# Altium footprint library mastermind.PCBLIB: 1061 footprints (part 32 of 67)
Each footprint in its own frame and in the unit in brackets; x right, y up, seen from the top. Pads: shape width x height; smd on the part's side, far side on the other; paste and mask are expansions set on the pad; w line width, h text height; cw(c..) or ccw(c..) is an arc to the next point about the centre after c.
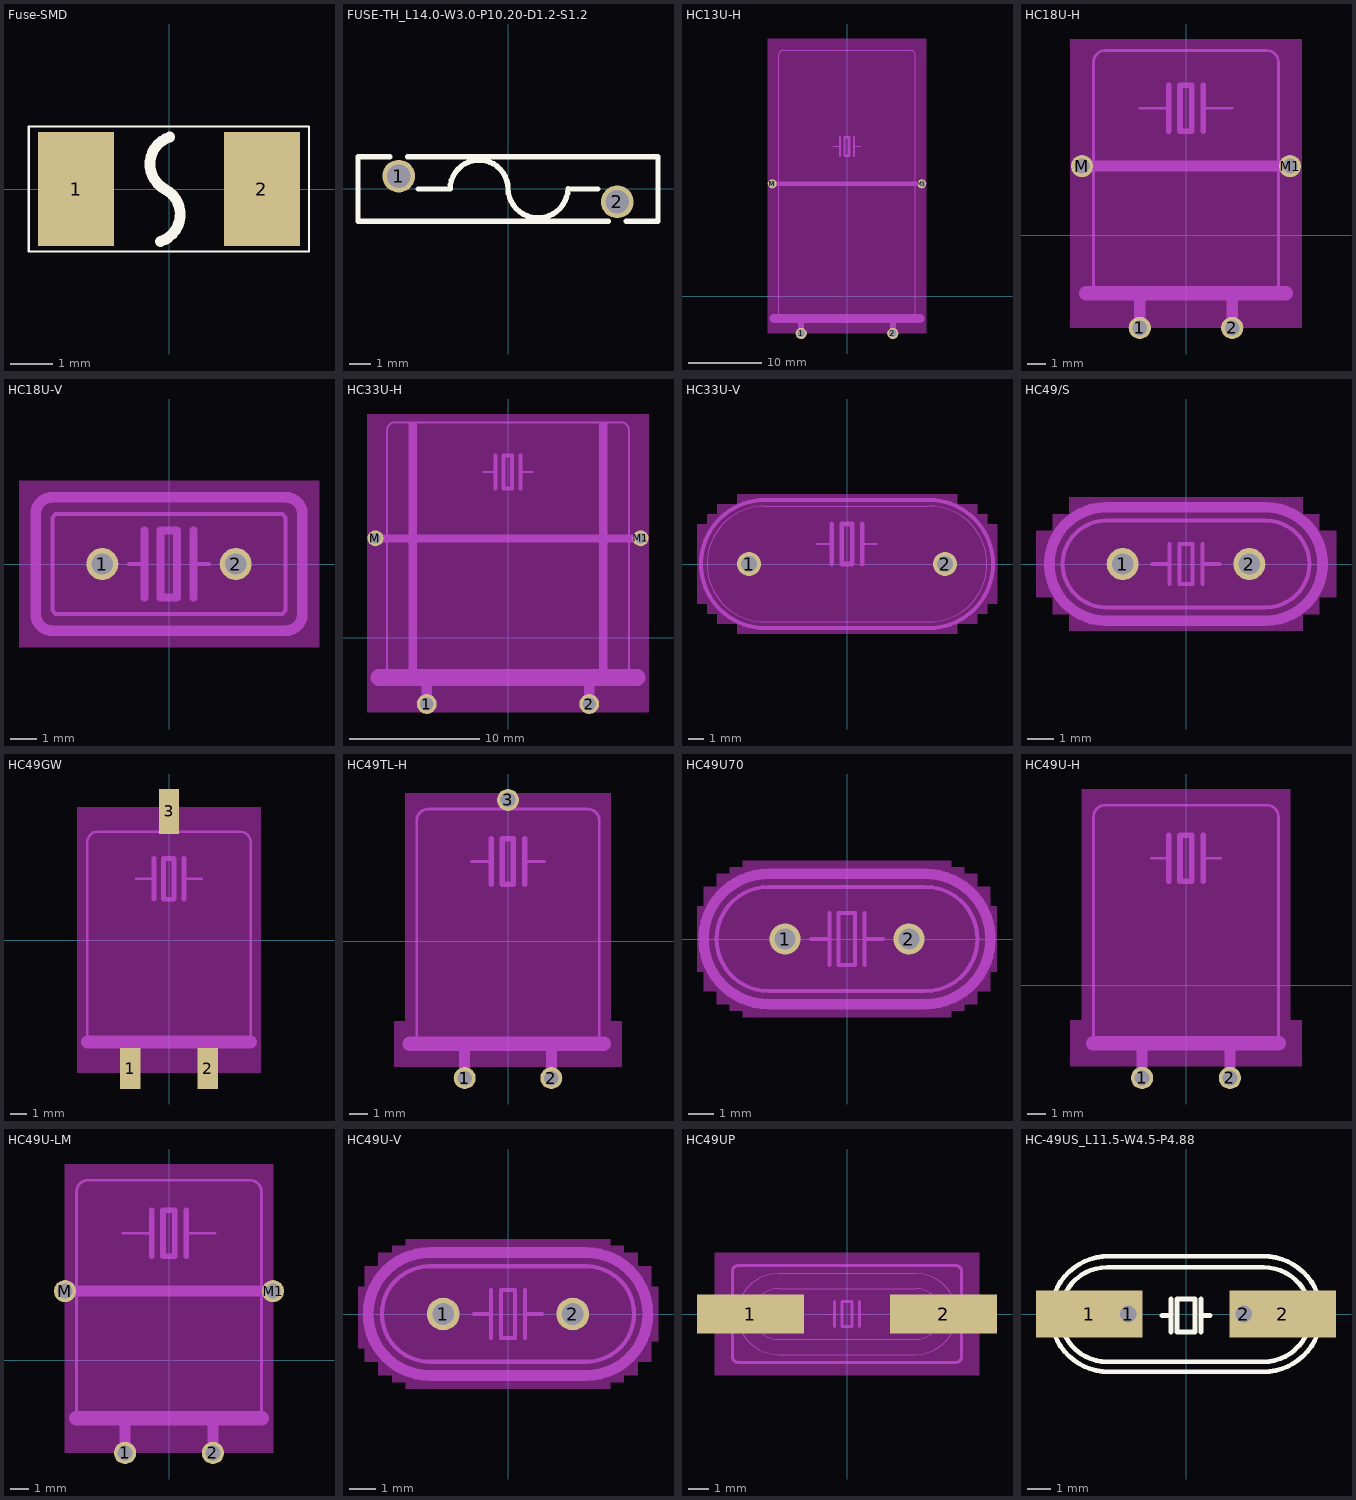
[diagram p31: the footprints below, top view; thin cyan lines are the x and y axes]

## Fuse-SMD [mm]
pads (2):
  rect 1.8x2.7 smd: 1(-2.2,0) 2(2.2,0)
Top Overlay:
  lines w0.051: -3.32,-1.483 3.31,-1.483 3.31,1.483 -3.32,1.483 -3.32,-1.483
  lines w0.254: -0.202,-1.244 ccw(c-0.408,-0.602) -0.093,-0.007 cw(c0.222,0.588) 0.017,1.23
Mechanical 8:
  region: -2.489,-1.321 -2.489,1.329 -1.639,1.329 -1.639,-1.321
  region: 1.651,-1.321 1.651,1.329 2.501,1.329 2.501,-1.321

## FUSE-TH_L14.0-W3.0-P10.20-D1.2-S1.2 [mil]
pads (2):
  round 60 hole 43.31 paste-99999 mask+2: 1(-200.79,23.63) 2(200.79,-23.62)
Top Overlay:
  lines w10: -239.89,59.05 -275.59,59.05 ; -217.19,59.05 -275.59,59.05 ; -184.38,59.05 4.33,59.05 ; -165.35,0 -106.3,0 cw(c-53.15,0) 0,0 ; -161.69,59.05 275.59,59.05 275.59,-59.06 239.89,-59.06 ; 0,0.5 ccw(c55.1,1.98) 110.2,0.5 ; 110.24,0 165.35,0 ; 112.33,-59.06 184.41,-59.06 ; 161.69,-59.06 -275.59,-59.06 -275.59,59.05 ; 217.17,-59.06 260.33,-59.06

## HC13U-H [mil]
pads (4):
  round 60 hole 40: 1(-245,-200) 2(245,-200)
  round 48 hole 32: M(-400,600) M1(400,600)
Top Layer keep-out:
  region: -425,-200 -425,1375 425,1375 425,-200
Mechanical 2:
  lines w6: -365,-120 -365,580 ; -365,620 -365,1290 cw(c-340,1290) -340,1315 340,1315 cw(c340,1290) 365,1290 365,620 ; -75,800 -37,800 ; 37,800 75,800 ; 365,-120 365,580
  lines w12: -37,750 -37,800 -37,850 ; 37,750 37,800 37,850 ; -13,750 -13,850 12,850 12,750 -13,750
  lines w24: -355,600 355,600
  lines w50: -390,-120 -365,-120 365,-120 390,-120
Mechanical 8:
  lines w6: -365,580 -365,620 ; 365,580 365,620
  lines w24: -400,600 -360,600 ; 360,600 400,600
  lines w32: -245,-200 -245,-125 ; 245,-200 245,-125

## HC18U-H [mil]
pads (4):
  round 48 hole 32: 1(-100,-200) 2(100,-200) M(-225,150) M1(225,150)
Top Layer keep-out:
  region: -250,-200 -250,425 250,425 250,-200
Mechanical 2:
  lines w6: -200,-125 -200,125 ; -200,175 -200,375 cw(c-175,375) -175,400 175,400 cw(c175,375) 200,375 200,180 ; -100,275 -37,275 ; 37,275 100,275 ; 200,-125 200,120
  lines w12: -37,225 -37,275 -37,325 ; 37,225 37,275 37,325 ; -13,225 -13,325 12,325 12,225 -13,225
  lines w24: -180,150 180,150
  lines w32: -215,-125 -200,-125 200,-125 215,-125
Mechanical 8:
  lines w6: -200,125 -200,175 ; 200,120 200,150 200,180
  lines w24: -225,150 -185,150 ; -100,-200 -100,-130 ; 100,-200 100,-130 ; 180,150 200,150 225,150

## HC18U-V [mil]
pads (2):
  round 48 hole 32: 1(-100,0) 2(100,0)
Top Layer keep-out:
  region: -225,-125 -225,125 225,125 225,-125
Mechanical 2:
  lines w6: -60,0 -37,0 ; 37,0 60,0 ; -175,-70 -170,-75 170,-75 175,-70 175,70 170,75 -170,75 -175,70 -175,-70
  lines w12: -37,-50 -37,0 -37,50 ; 37,-50 37,0 37,50 ; -13,-50 12,-50 12,50 -13,50 -13,-50
  lines w16: -200,-75 ccw(c-175,-75) -175,-100 175,-100 ccw(c175,-75) 200,-75 200,75 ccw(c175,75) 175,100 -175,100 ccw(c-175,75) -200,75 -200,-75

## HC33U-H [mil]
pads (4):
  round 60 hole 40: 1(-245,-200) 2(245,-200)
  round 48 hole 32: M(-400,300) M1(400,300)
Top Layer keep-out:
  region: -425,-225 -425,675 425,675 425,-225
Mechanical 2:
  region: -300,-125 -300,650 -275,650 -275,-125
  region: 275,-125 275,650 300,650 300,-125
  lines w6: -365,-120 -365,280 ; -365,320 -365,625 cw(c-340,625) -340,650 340,650 cw(c340,625) 365,625 365,320 ; -75,500 -37,500 ; 37,500 75,500 ; 365,-120 365,280
  lines w12: -37,450 -37,500 -37,550 ; 37,450 37,500 37,550 ; -13,450 -13,550 12,550 12,450 -13,450
  lines w24: -355,300 355,300
  lines w50: -390,-120 -365,-120 365,-120 390,-120
Mechanical 8:
  lines w6: -365,280 -365,320 ; 365,280 365,320
  lines w24: -400,300 -360,300 ; 360,300 400,300
  lines w32: -245,-200 -245,-125 ; 245,-200 245,-125

## HC33U-V [mil]
pads (2):
  round 60 hole 40: 1(-245,0) 2(245,0)
Top Layer keep-out:
  region: 350,-100 350,100 375,100 375,-100
  region: 325,-125 325,125 350,125 350,-125
  region: 275,-150 275,150 325,150 325,-150
  region: -275,-175 -275,175 275,175 275,-175
  region: -375,-100 -375,100 -350,100 -350,-100
  region: -350,-125 -350,125 -325,125 -325,-125
  region: -325,-150 -325,150 -275,150 -275,-150
Mechanical 2:
  lines w2: -205,-145 cw(c-205,0) -205,145 205,145 cw(c205,0) 205,-145 -205,-145
  lines w6: -75,50 -38,50 ; 38,50 75,50
  lines w10: -205,-160 cw(c-205,0) -205,160 205,160 cw(c205,0) 205,-160 -205,-160
  lines w12: -38,0 -38,50 -38,100 ; 38,0 38,50 38,100 ; -13,0 13,0 13,100 -13,100 -13,0

## HC49/S [mil]
pads (2):
  round 48 hole 32: 1(-95,0) 2(95,0)
Top Layer keep-out:
  region: 200,-50 200,50 225,50 225,-50
  region: 175,-75 175,75 200,75 200,-75
  region: -225,-50 -225,50 -200,50 -200,-50
  region: -200,-75 -200,75 -175,75 -175,-75
  region: -175,-100 -175,100 175,100 175,-100
Mechanical 2:
  lines w6: -50,0 -25,0 ; -25,-30 -25,0 ; -25,30 -25,0 ; 25,-30 25,0 ; 25,30 25,0 ; 50,0 25,0 ; -120,-65 cw(c-120,0) -120,65 120,65 cw(c120,0) 120,-65 -120,-65 ; -10,-30 -10,30 10,30 10,-30 -10,-30
  lines w16: -120,-85 cw(c-120,0) -120,85 120,85 cw(c120,0) 120,-85 -120,-85

## HC49GW [mil]
pads (3):
  rect 50x100 smd: 1(-95,-315) 2(95,-315)
  rect 50x110 smd: 3(0,315)
Top Layer keep-out:
  region: -225,-325 -225,325 225,325 225,-325
Mechanical 2:
  lines w6: -200,-250 -200,240 cw(c-175,240) -175,265 -40,265 ; -80,150 -37,150 ; 37,150 80,150 ; 40,265 175,265 cw(c175,240) 200,240 200,-250
  lines w12: -37,100 -37,150 -37,200 ; 37,100 37,150 37,200 ; -13,100 12,100 12,200 -13,200 -13,100
  lines w32: -200,-250 200,-250
Mechanical 8:
  lines w6: -40,265 40,265
  lines w24: -95,-325 -95,-260 ; 0,275 0,330 ; 95,-330 95,-255

## HC49TL-H [mil]
pads (3):
  round 48 hole 32: 1(-95,-300) 2(95,-300) 3(0,310)
Top Layer keep-out:
  region: -225,-175 -225,325 225,325 225,-175
  region: -250,-275 -250,-175 250,-175 250,-275
Mechanical 2:
  lines w6: -200,-225 -200,265 cw(c-175,265) -175,290 -45,290 ; -80,175 -37,175 ; 37,175 80,175 ; 45,290 175,290 cw(c175,265) 200,265 200,-225
  lines w12: -37,125 -37,175 -37,225 ; 37,125 37,175 37,225 ; -13,125 12,125 12,225 -13,225 -13,125
  lines w32: -215,-225 210,-225
Mechanical 8:
  region: -12,290 -12,298 12,298 12,290
  lines w6: -45,290 45,290
  lines w24: -95,-300 -95,-230 ; 0,300 0,310 ; 95,-300 95,-230

## HC49U70 [mil]
pads (2):
  round 48 hole 32: 1(-95,0) 2(95,0)
Top Layer keep-out:
  region: 220,-50 220,50 230,50 230,-50
  region: 200,-80 200,80 220,80 220,-80
  region: 180,-100 180,100 200,100 200,-100
  region: 160,-110 160,110 180,110 180,-110
  region: -160,-120 -160,120 160,120 160,-120
  region: -230,-50 -230,50 -220,50 -220,-50
  region: -220,-80 -220,80 -200,80 -200,-80
  region: -200,-100 -200,100 -180,100 -180,-100
  region: -180,-110 -180,110 -160,110 -160,-110
Mechanical 2:
  lines w6: -55,0 -27,0 ; -27,-40 -27,0 ; -27,40 -27,0 ; 27,-40 27,0 ; 27,40 27,0 ; 55,0 27,0 ; -120,-80 cw(c-120,0) -120,80 120,80 cw(c120,0) 120,-80 -120,-80 ; -13,-40 12,-40 12,40 -13,40 -13,-40
  lines w16: -120,-100 cw(c-120,0) -120,100 120,100 cw(c120,0) 120,-100 -120,-100

## HC49U-H [mil]
pads (2):
  round 48 hole 32: 1(-95,-200) 2(95,-200)
Top Layer keep-out:
  region: -225,-75 -225,425 225,425 225,-75
  region: -250,-175 -250,-75 250,-75 250,-175
Mechanical 2:
  lines w6: -200,-125 -200,365 cw(c-175,365) -175,390 175,390 cw(c175,365) 200,365 200,-125 ; -75,275 -37,275 ; 37,275 75,275
  lines w12: -37,225 -37,275 -37,325 ; 37,225 37,275 37,325 ; -13,225 12,225 12,325 -13,325 -13,225
  lines w32: -200,-125 200,-125
Mechanical 8:
  lines w24: -95,-200 -95,-130 ; 95,-200 95,-130

## HC49U-LM [mil]
pads (4):
  round 48 hole 32: 1(-95,-200) 2(95,-200) M(-225,150) M1(225,150)
Top Layer keep-out:
  region: -225,-200 -225,425 225,425 225,-200
Mechanical 2:
  lines w6: -200,-125 -200,125 ; -200,175 -200,365 cw(c-175,365) -175,390 175,390 cw(c175,365) 200,365 200,180 ; -100,275 -37,275 ; 37,275 100,275 ; 200,-125 200,120
  lines w12: -37,225 -37,275 -37,325 ; 37,225 37,275 37,325 ; -13,225 12,225 12,325 -13,325 -13,225
  lines w24: -180,150 180,150
  lines w32: -200,-125 200,-125
Mechanical 8:
  lines w6: -200,125 -200,175 ; 200,120 200,150 200,180
  lines w24: -225,150 -185,150 ; -95,-200 -95,-130 ; 95,-200 95,-130 ; 180,150 200,150 225,150

## HC49U-V [mil]
pads (2):
  round 48 hole 32: 1(-95,0) 2(95,0)
Top Layer keep-out:
  region: 210,-40 210,40 220,40 220,-40
  region: 190,-70 190,70 210,70 210,-70
  region: 170,-90 170,90 190,90 190,-90
  region: 150,-100 150,100 170,100 170,-100
  region: -220,-50 -220,40 -210,40 -210,-50
  region: -210,-70 -210,70 -190,70 -190,-70
  region: -190,-90 -190,90 -170,90 -170,-90
  region: -170,-100 -170,100 -150,100 -150,-100
  region: -150,-110 -150,110 150,110 150,-110
Mechanical 2:
  lines w6: -50,0 -25,0 ; -25,-35 -25,0 ; -25,35 -25,0 ; 25,-35 25,0 ; 25,35 25,0 ; 50,0 25,0 ; -115,-70 cw(c-115,0) -115,70 115,70 cw(c115,0) 115,-70 -115,-70 ; -10,-35 -10,35 10,35 10,-35 -10,-35
  lines w16: -115,-90 cw(c-115,0) -115,90 115,90 cw(c115,0) 115,-90 -115,-90

## HC49UP [mil]
pads (2):
  rect 210x76 smd: 1(-190,0) 2(190,0)
Top Layer keep-out:
  region: -260,-120 -260,120 260,120 260,-120
Mechanical 2:
  lines w2: -201.15,-45 ccw(c-135,0) -135,-80 135,-80 ccw(c135,0) 201.14,-45 ; -201.15,45 cw(c-135,-0.01) -135,80 135,80 cw(c135,0) 201.15,45 ; -156.8,-45 ccw(c-135,0.01) -135,-50 135,-50 ccw(c135,0.01) 156.8,-45 ; -156.8,45 cw(c-135,-0.01) -135,50 135,50 cw(c135,-0.01) 156.8,45 ; -40,0 -25,0 ; 25,0 40,0
  lines w6: -225,-45 -225,-85 ccw(c-215,-85) -215,-95 215,-95 ccw(c215,-85) 225,-85 225,-45 ; -225,45 -225,85 cw(c-215,85) -215,95 215,95 cw(c215,85) 225,85 225,45 ; -25,-25 -25,0 -25,25 ; 25,-25 25,0 25,25 ; -10,-25 10,-25 10,25 -10,25 -10,-25
Mechanical 8:
  lines w2: -201.15,-45 cw(c-135,0) -201.15,45 ; -156.8,-45 cw(c-135,0) -156.8,45 ; 156.8,-45 ccw(c135,0) 156.8,45 ; 201.15,-45 ccw(c135,0) 201.15,45
  lines w6: -225,-45 -225,-15 ; -225,45 -225,15 ; 225,-45 225,45 ; 225,-15 255,-15 255,15 225,15 ; -225,-15 -255,-15 -255,15 -225,15 ; -225,-15 -225,15

## HC-49US_L11.5-W4.5-P4.88 [mm]
pads (4):
  rect 4.5x2 smd: 1(-4.1,0) 2(4.1,0)
  round 1 hole 0.7: 1(-2.438,0) 2(2.438,0)
Top Overlay:
  lines w0.2: -3.273,-2.45 cw(c-3.273,0) -3.273,2.45 ; -3.2,-2.45 3.2,-2.45 ; -3.2,2.45 3.2,2.45 ; -1.016,-0.064 -0.635,-0.064 ; -0.635,-0.762 -0.635,0.635 ; 0.635,-0.762 0.635,0.635 ; 0.635,-0.064 1.016,-0.064 ; 3.273,-2.45 ccw(c3.273,0) 3.273,2.45 ; -3.334,-2.024 cw(c-3.334,-0.024) -3.334,1.976 3.281,1.976 cw(c3.281,-0.024) 3.281,-2.024 -3.334,-2.024 ; -0.381,-0.762 0.381,-0.762 0.381,0.635 -0.381,0.635 -0.381,-0.762
3D body "step_temp.STEP": height 2.6, standoff 0, extent -6.6,-2.35 6.6,2.35